# Altium footprint library PcbLib1.PcbLib: 209 footprints (part 6 of 14)
Each footprint in its own frame and in the unit in brackets; x right, y up, seen from the top. Pads: shape width x height; smd on the part's side, far side on the other; paste and mask are expansions set on the pad; w line width, h text height; cw(c..) or ccw(c..) is an arc to the next point about the centre after c.
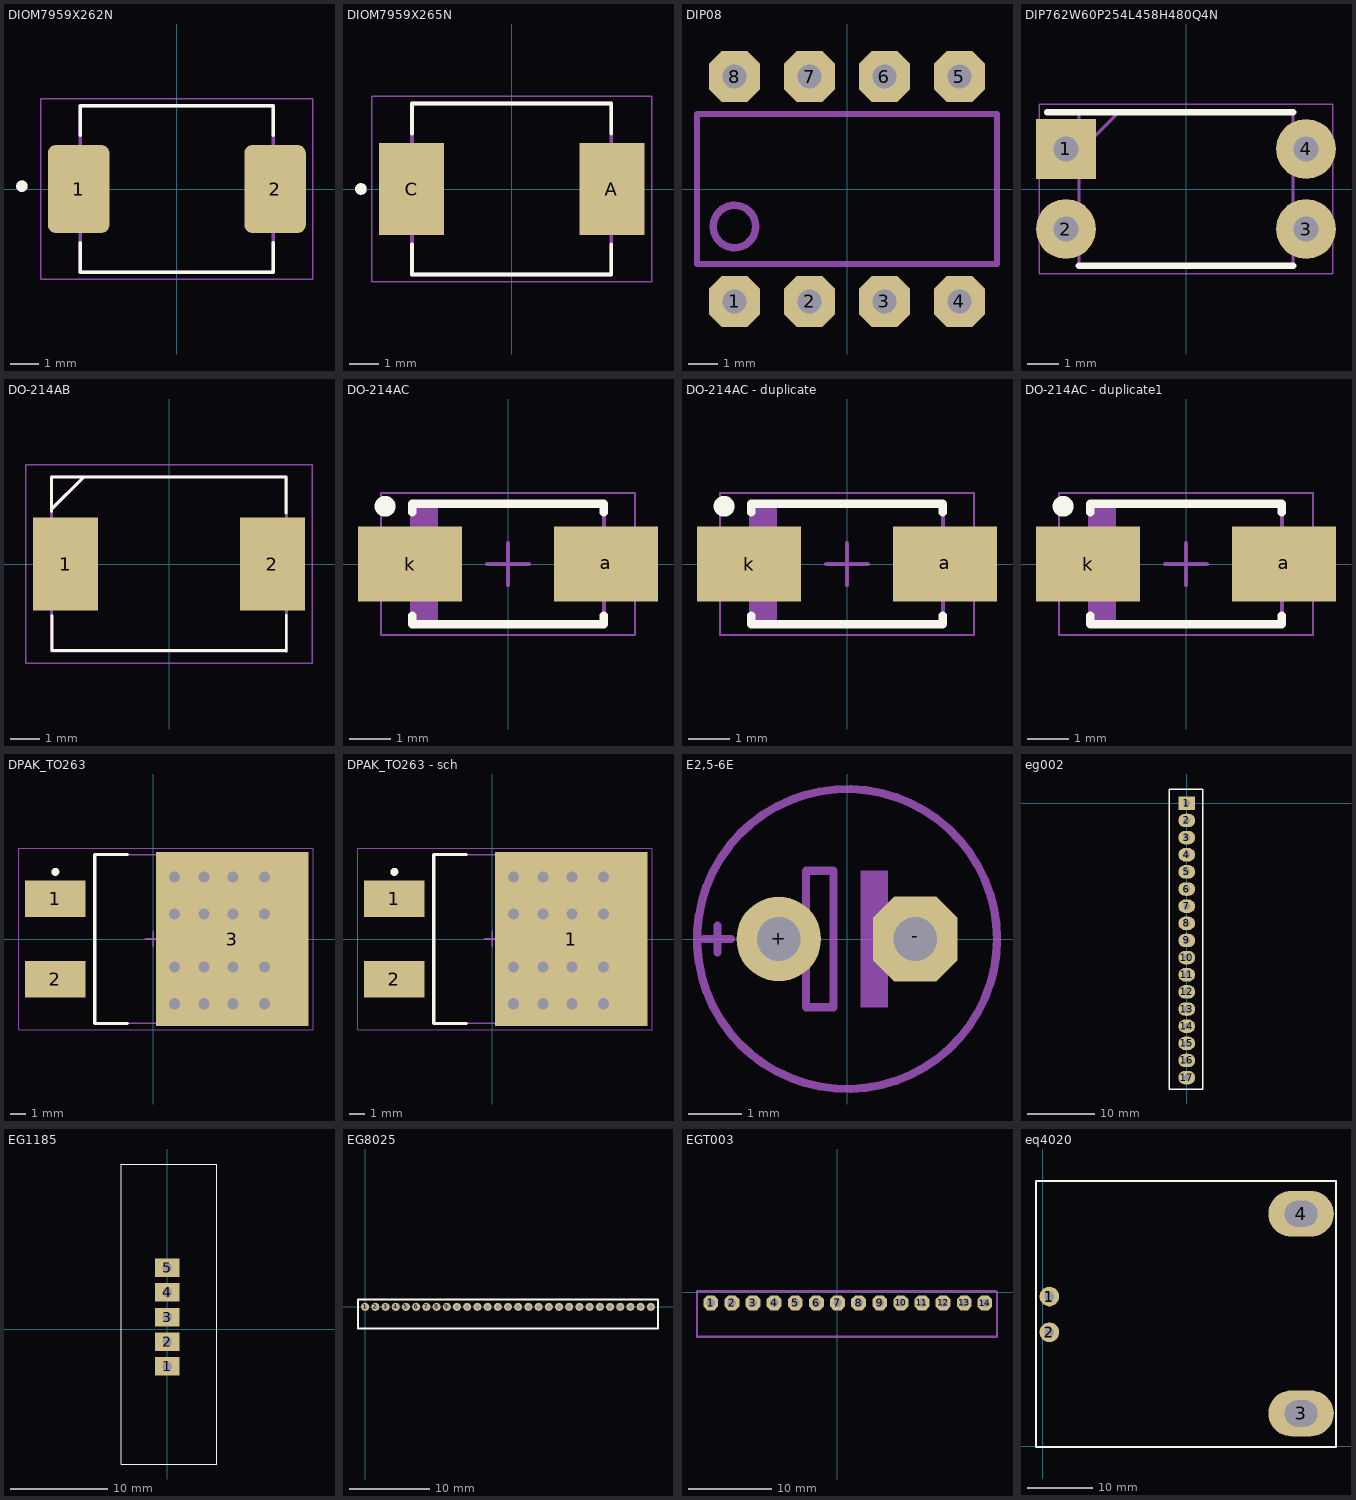
[diagram p5: the footprints below, top view; thin cyan lines are the x and y axes]

## DIOM7959X262N [mm]
pads (2):
  rrect25% 2.18x3.12 smd: 1(-3.485,0) 2(3.485,0)
Top Overlay:
  circle w0.2: c-5.5,0.1 r0.1
  lines w0.127: -3.427,-1.9 -3.427,-2.953 3.427,-2.953 3.427,-1.9 ; -3.427,1.9 -3.427,2.953 3.427,2.953 3.427,1.9
Mechanical 13:
  circle w0.2: c-5.5,0.1 r0.1
  lines w0.127: -3.427,-2.953 -3.427,2.953 3.427,2.953 3.427,-2.953 -3.427,-2.953
Mechanical 15:
  lines w0.05: -4.825,-3.203 -4.825,3.203 4.825,3.203 4.825,-3.203 -4.825,-3.203
3D body "SMCJ300CA.STEP": height 2.71, standoff 0.09, extent -3.964,-2.963 3.974,2.943

## DIOM7959X265N [mm]
pads (2):
  rect 2.25x3.18 smd: A(3.455,0) C(-3.455,0)
Top Overlay:
  circle w0.2: c-5.2,0 r0.1
  lines w0.127: -3.437,-1.91 -3.437,-2.95 3.437,-2.95 3.437,-1.91 ; -3.437,1.91 -3.437,2.95 3.437,2.95 3.437,1.91
Mechanical 13:
  circle w0.2: c-5.2,0 r0.1
  lines w0.127: -3.437,-2.95 3.437,-2.95 3.437,2.95 -3.437,2.95 -3.437,-2.95
Mechanical 15:
  lines w0.05: -4.83,-3.2 -4.83,3.2 4.83,3.2 4.83,-3.2 -4.83,-3.2
3D body "SK54.STEP": height 2.62, standoff 0, extent -4.097,-2.952 3.843,2.952

## DIP08 [mil] "DIP08"
pads (8):
  oct 68x68 / inner round 0 / far side oct 68x68 hole 32: 1(-150,-150) 2(-50,-150) 3(50,-150) 4(150,-150) 5(150,150) 6(50,150) 7(-50,150) 8(-150,150)
Bottom 3D Body:
  circle w10: c-150,-50 r28.28
  lines w8: -200,-40 -200,-60 ; -200,-60 -200,-100 200,-100 200,100 -200,100 -200,-60
3D body: height 50, standoff 0, extent -181.68,118.32 -118.32,181.68
3D body: height 50, standoff 0, extent -81.68,118.32 -18.32,181.68
3D body: height 50, standoff 0, extent 18.32,118.32 81.68,181.68
3D body: height 50, standoff 0, extent 118.32,118.32 181.68,181.68
3D body: height 50, standoff 0, extent 118.32,-181.68 181.68,-118.32
3D body: height 50, standoff 0, extent 18.32,-181.68 81.68,-118.32
3D body: height 50, standoff 0, extent -81.68,-181.68 -18.32,-118.32
3D body: height 50, standoff 0, extent -181.68,-181.68 -118.32,-118.32

## DIP762W60P254L458H480Q4N [mm]
pads (4):
  rect 1.9x1.9 hole 0.8: 1(-3.81,1.27)
  round 1.9 hole 0.8: 2(-3.81,-1.27) 3(3.81,-1.27) 4(3.81,1.27)
Top Overlay:
  lines w0.2: -4.41,2.44 3.4,2.44 ; -3.4,-2.44 3.4,-2.44
Mechanical 13:
  lines w0.1: -3.4,1.17 -2.13,2.44 ; -3.4,-2.44 3.4,-2.44 3.4,2.44 -3.4,2.44 -3.4,-2.44
Mechanical 15:
  lines w0.05: -4.66,-2.69 4.66,-2.69 4.66,2.69 -4.66,2.69 -4.66,-2.69
3D body "EL817(C).stp": height 4.8, standoff -3.5, extent -3.96,-2.29 3.96,2.29

## DO-214AB [mm]
pads (2):
  rect 2.2x3.15 smd: 1(-3.5,0) 2(3.5,0)
Top Overlay:
  lines w0.1: -3.969,1.769 -3.969,2.939 3.952,2.939 3.952,1.726 ; -3.969,1.865 -2.904,2.93 -2.897,2.93 ; -3.961,-1.735 -3.961,-2.932 3.957,-2.932 3.966,-2.941 3.966,-1.735
Mechanical 13:
  lines w0.1: -3.97,1.852 -2.87,2.952 ; -3.97,-2.952 3.97,-2.952 3.97,2.952 -3.97,2.952 -3.97,-2.952
Mechanical 15:
  lines w0.05: -4.85,-3.36 4.85,-3.36 4.85,3.36 -4.85,3.36 -4.85,-3.36
3D body "1.5SMC15A.stp": height 2.62, standoff 0, extent -3.97,-2.953 3.97,2.953

## DO-214AC [mm]
height 1.35
pads (2):
  rect 2.5x1.8 smd: a(2.35,0) k(-2.35,0)
Top Overlay:
  circle w0.25: c-2.95,1.385 r0.125
  lines w0.2: -2.3,-1.235 -2.3,-1.45 2.3,-1.45 2.3,-1.235 ; -2.3,1.235 -2.3,1.45 2.3,1.45 2.3,1.235
Top Courtyard:
  lines w0.05: -3.05,-1.7 3.05,-1.7 3.05,1.7 -3.05,1.7 -3.05,-1.7
  lines w0.1: -0.5,0 0.5,0 ; 0,-0.5 0,0.5
Top Assembly:
  rectangle: -2.3,-1.45 -1.681,1.45
  lines w0.1: -2.3,-1.45 2.3,-1.45 2.3,1.45 -2.3,1.45 -2.3,-1.45
3D body "User Library-DO-214AC(SMA).STEP": height 2.3, standoff 0.01, extent -2.768,-1.422 2.718,1.372

## DO-214AC - duplicate [mm]
height 1.35
pads (2):
  rect 2.5x1.8 smd: a(2.35,0) k(-2.35,0)
Top Overlay:
  circle w0.25: c-2.95,1.385 r0.125
  lines w0.2: -2.3,-1.235 -2.3,-1.45 2.3,-1.45 2.3,-1.235 ; -2.3,1.235 -2.3,1.45 2.3,1.45 2.3,1.235
Top Courtyard:
  lines w0.05: -3.05,-1.7 3.05,-1.7 3.05,1.7 -3.05,1.7 -3.05,-1.7
  lines w0.1: -0.5,0 0.5,0 ; 0,-0.5 0,0.5
Top Assembly:
  rectangle: -2.3,-1.45 -1.681,1.45
  lines w0.1: -2.3,-1.45 2.3,-1.45 2.3,1.45 -2.3,1.45 -2.3,-1.45
3D body "User Library-DO-214AC(SMA).STEP": height 2.3, standoff 0.01, extent -2.768,-1.422 2.718,1.372

## DO-214AC - duplicate1 [mm]
height 1.35
pads (2):
  rect 2.5x1.8 smd: a(2.35,0) k(-2.35,0)
Top Overlay:
  circle w0.25: c-2.95,1.385 r0.125
  lines w0.2: -2.3,-1.235 -2.3,-1.45 2.3,-1.45 2.3,-1.235 ; -2.3,1.235 -2.3,1.45 2.3,1.45 2.3,1.235
Top Courtyard:
  lines w0.05: -3.05,-1.7 -3.05,1.7 3.05,1.7 3.05,-1.7 -3.05,-1.7
  lines w0.1: -0.5,0 0.5,0 ; 0,-0.5 0,0.5
Top Assembly:
  rectangle: -2.3,-1.45 -1.681,1.45
  lines w0.1: -2.3,-1.45 -2.3,1.45 2.3,1.45 2.3,-1.45 -2.3,-1.45
3D body "User Library-DO-214AC(SMA).STEP": height 2.3, standoff 0.01, extent -2.768,-1.422 2.718,1.372

## DPAK_TO263 [mm] "D2-PAK, 3-Pads, Body 7.93x8.70mm (max), IPC Medium Density"
height 4.8
pads (3):
  rect 3.81x2.32 smd: 1(-6.2,2.54) 2(-6.2,-2.54)
  rect 9.65x11 smd: 3(5,0)
via 1.35,3.925 diameter 1.27 hole 0.711
via 3.225,3.925 diameter 1.27 hole 0.711
via 5.05,3.925 diameter 1.27 hole 0.711
via 7.05,3.925 diameter 1.27 hole 0.711
via 1.35,1.575 diameter 1.27 hole 0.711
via 3.225,1.575 diameter 1.27 hole 0.711
via 5.05,1.575 diameter 1.27 hole 0.711
via 7.05,1.575 diameter 1.27 hole 0.711
via 1.35,-1.775 diameter 1.27 hole 0.711
via 3.225,-1.775 diameter 1.27 hole 0.711
via 5.05,-1.775 diameter 1.27 hole 0.711
via 7.05,-1.775 diameter 1.27 hole 0.711
via 1.35,-4.1 diameter 1.27 hole 0.711
via 3.225,-4.1 diameter 1.27 hole 0.711
via 5.05,-4.1 diameter 1.27 hole 0.711
via 7.05,-4.1 diameter 1.27 hole 0.711
Top Overlay:
  circle w0.25: c-6.2,4.25 r0.125
  lines w0.2: -1.625,-5.35 -3.7,-5.35 -3.7,5.35 -1.625,5.35
Top Courtyard:
  lines w0.05: -8.5,-5.75 10.125,-5.75 10.125,5.75 -8.5,5.75 -8.5,-5.75
  lines w0.1: -0.5,0 0.5,0 ; 0,-0.5 0,0.5
Top Assembly:
  lines w0.1: -3.7,-5.325 5.95,-5.325 5.95,5.325 -3.7,5.325 -3.7,-5.325
3D body "User Library-TO263-3S.STEP": height 4.81, standoff 0.01, extent -7.515,-4.975 8.155,5.025

## DPAK_TO263 - sch [mm] "D2-PAK, 3-Pads, Body 7.93x8.70mm (max), IPC Medium Density"
height 4.8
pads (3):
  rect 3.81x2.32 smd: 1(-6.2,2.54) 2(-6.2,-2.54)
  rect 9.65x11 smd: 1(5,0)
via 1.35,3.925 diameter 1.27 hole 0.711
via 3.225,3.925 diameter 1.27 hole 0.711
via 5.05,3.925 diameter 1.27 hole 0.711
via 7.05,3.925 diameter 1.27 hole 0.711
via 1.35,1.575 diameter 1.27 hole 0.711
via 3.225,1.575 diameter 1.27 hole 0.711
via 5.05,1.575 diameter 1.27 hole 0.711
via 7.05,1.575 diameter 1.27 hole 0.711
via 1.35,-1.775 diameter 1.27 hole 0.711
via 3.225,-1.775 diameter 1.27 hole 0.711
via 5.05,-1.775 diameter 1.27 hole 0.711
via 7.05,-1.775 diameter 1.27 hole 0.711
via 1.35,-4.1 diameter 1.27 hole 0.711
via 3.225,-4.1 diameter 1.27 hole 0.711
via 5.05,-4.1 diameter 1.27 hole 0.711
via 7.05,-4.1 diameter 1.27 hole 0.711
Top Overlay:
  circle w0.25: c-6.2,4.25 r0.125
  lines w0.2: -1.625,-5.35 -3.7,-5.35 -3.7,5.35 -1.625,5.35
Top Courtyard:
  lines w0.05: -8.5,-5.75 10.125,-5.75 10.125,5.75 -8.5,5.75 -8.5,-5.75
  lines w0.1: -0.5,0 0.5,0 ; 0,-0.5 0,0.5
Top Assembly:
  lines w0.1: -3.7,-5.325 5.95,-5.325 5.95,5.325 -3.7,5.325 -3.7,-5.325
3D body "User Library-TO263-3S.STEP": height 4.81, standoff 0.01, extent -7.515,-4.975 8.155,5.025

## E2,5-6E [mil] "E2,5-6E"
pads (2):
  round 62 / inner round 0 / far side round 62 hole 32: +(-50,0)
  oct 62x62 / inner round 0 / far side oct 62x62 hole 32: -(50,0)
Bottom Assembly:
  region: 10,-50 10,50 30,50 30,-50
  lines w6: -65,0 -30,0 ; 25,0 65,0 ; -30,0 -30,-50 -10,-50 -10,50 -30,50 -30,0
Bottom 3D Body:
  circle w6: c0,0 r110
  lines w6: -105,0 -85,0 ; -95,-10 -95,10
3D body: height 150, standoff 0, extent -68.25,-3.25 -26.75,3.25
3D body: height 150, standoff 0, extent -33.25,-53.25 -26.75,3.25
3D body: height 150, standoff 0, extent -33.25,-53.25 -6.75,-46.75
3D body: height 150, standoff 0, extent -13.25,-53.25 -6.75,53.25
3D body: height 150, standoff 0, extent -33.25,46.75 -6.75,53.25
3D body: height 150, standoff 0, extent -33.25,-3.25 -26.75,53.25
3D body: height 150, standoff 0, extent 21.75,-3.25 68.25,3.25
3D body: height 150, standoff 0, extent 10,-50 30,50
3D body: height 50, standoff 0, extent 21.11,-28.89 78.89,28.89
3D body: height 50, standoff 0, extent -81.27,-31.27 -18.73,31.27

## eg002 [mm]
pads (17):
  rect 2.5x2 hole 1: 1(0,0)
  oval 2.5x2 hole 1: 2(0,-2.54) 3(0,-5.08) 4(0,-7.62) 5(0,-10.16) 6(0,-12.7) 7(0,-15.24) 8(0,-17.78) 9(0,-20.32) 10(0,-22.86) 11(0,-25.4) 12(0,-27.94) 13(0,-30.48) 14(0,-33.02) 15(0,-35.56) 16(0,-38.1) 17(0,-40.64)
Top Overlay:
  lines w0.2: 2.315,2.12 -2.565,2.12 -2.565,-42.325 2.35,-42.325 2.35,2.12
3D body "SPWM Controller.step": height 34.09, standoff -6.79, extent -4.975,-41.283 1.315,5.583

## EG1185 [mm]
pads (5):
  rect 2.5x1.9 hole 1: 1(0,-3.81) 2(0,-1.27) 3(0,1.27) 4(0,3.81) 5(0,6.35)
Top Overlay:
  lines w0.1: 5.08,-11.684 5.08,-13.843 2.921,-13.843 -4.699,-13.843 -4.699,17.018 5.08,17.018 5.08,-11.634

## EG8025 [mm]
pads (29):
  round 1 hole 0.5: 1(0,0) 2(1.27,0) 3(2.54,0) 4(3.81,0) 5(5.08,0) 6(6.35,0) 7(7.62,0) 8(8.89,0) 9(10.16,0) 10(11.43,0) 11(12.7,0) 12(13.97,0) 13(15.24,0) 14(16.51,0) 15(17.78,0) 16(19.05,0) 17(20.32,0) 18(21.59,0) 19(22.86,0) 20(24.13,0) 21(25.4,0) 22(26.67,0) 23(27.94,0) 24(29.21,0) 25(30.48,0) 26(31.75,0) 27(33.02,0) 28(34.29,0) 29(35.56,0)
Top Overlay:
  lines w0.254: -0.889,-2.667 -0.889,0.889 36.449,0.889 36.449,-2.667 -0.889,-2.667

## EGT003 [mil] "2X13"
pads (14):
  oct 70x70 / inner round 0 / far side oct 70x70 hole 40: 1(-600,-50) 2(-500,-50) 3(-400,-50) 4(-300,-50) 5(-200,-50) 6(-100,-50) 7(0,-50) 8(100,-50) 9(200,-50) 10(300,-50) 11(400,-50) 12(500,-50) 13(600,-50) 14(696.67,-50.56)
Bottom Courtyard:
  lines w10: -665,-210 755,-210 755,0 750,5 -665,5 -665,-210

## eq4020 [mm]
pads (4):
  round 3 hole 1.5: 1(1.016,22.86) 2(1.016,17.399)
  oval 10x7 hole 4 slot 5 at 0 deg: 3(39.497,5) 4(39.497,35.5)
Top Overlay:
  lines w0.254: -1.016,-0.127 44.831,-0.127 44.831,40.513 -1.016,40.513 -1.016,-0.127